# Altium schematic symbol library IC_ADI.SCHLIB: 3169 symbols (part 28 of 181)
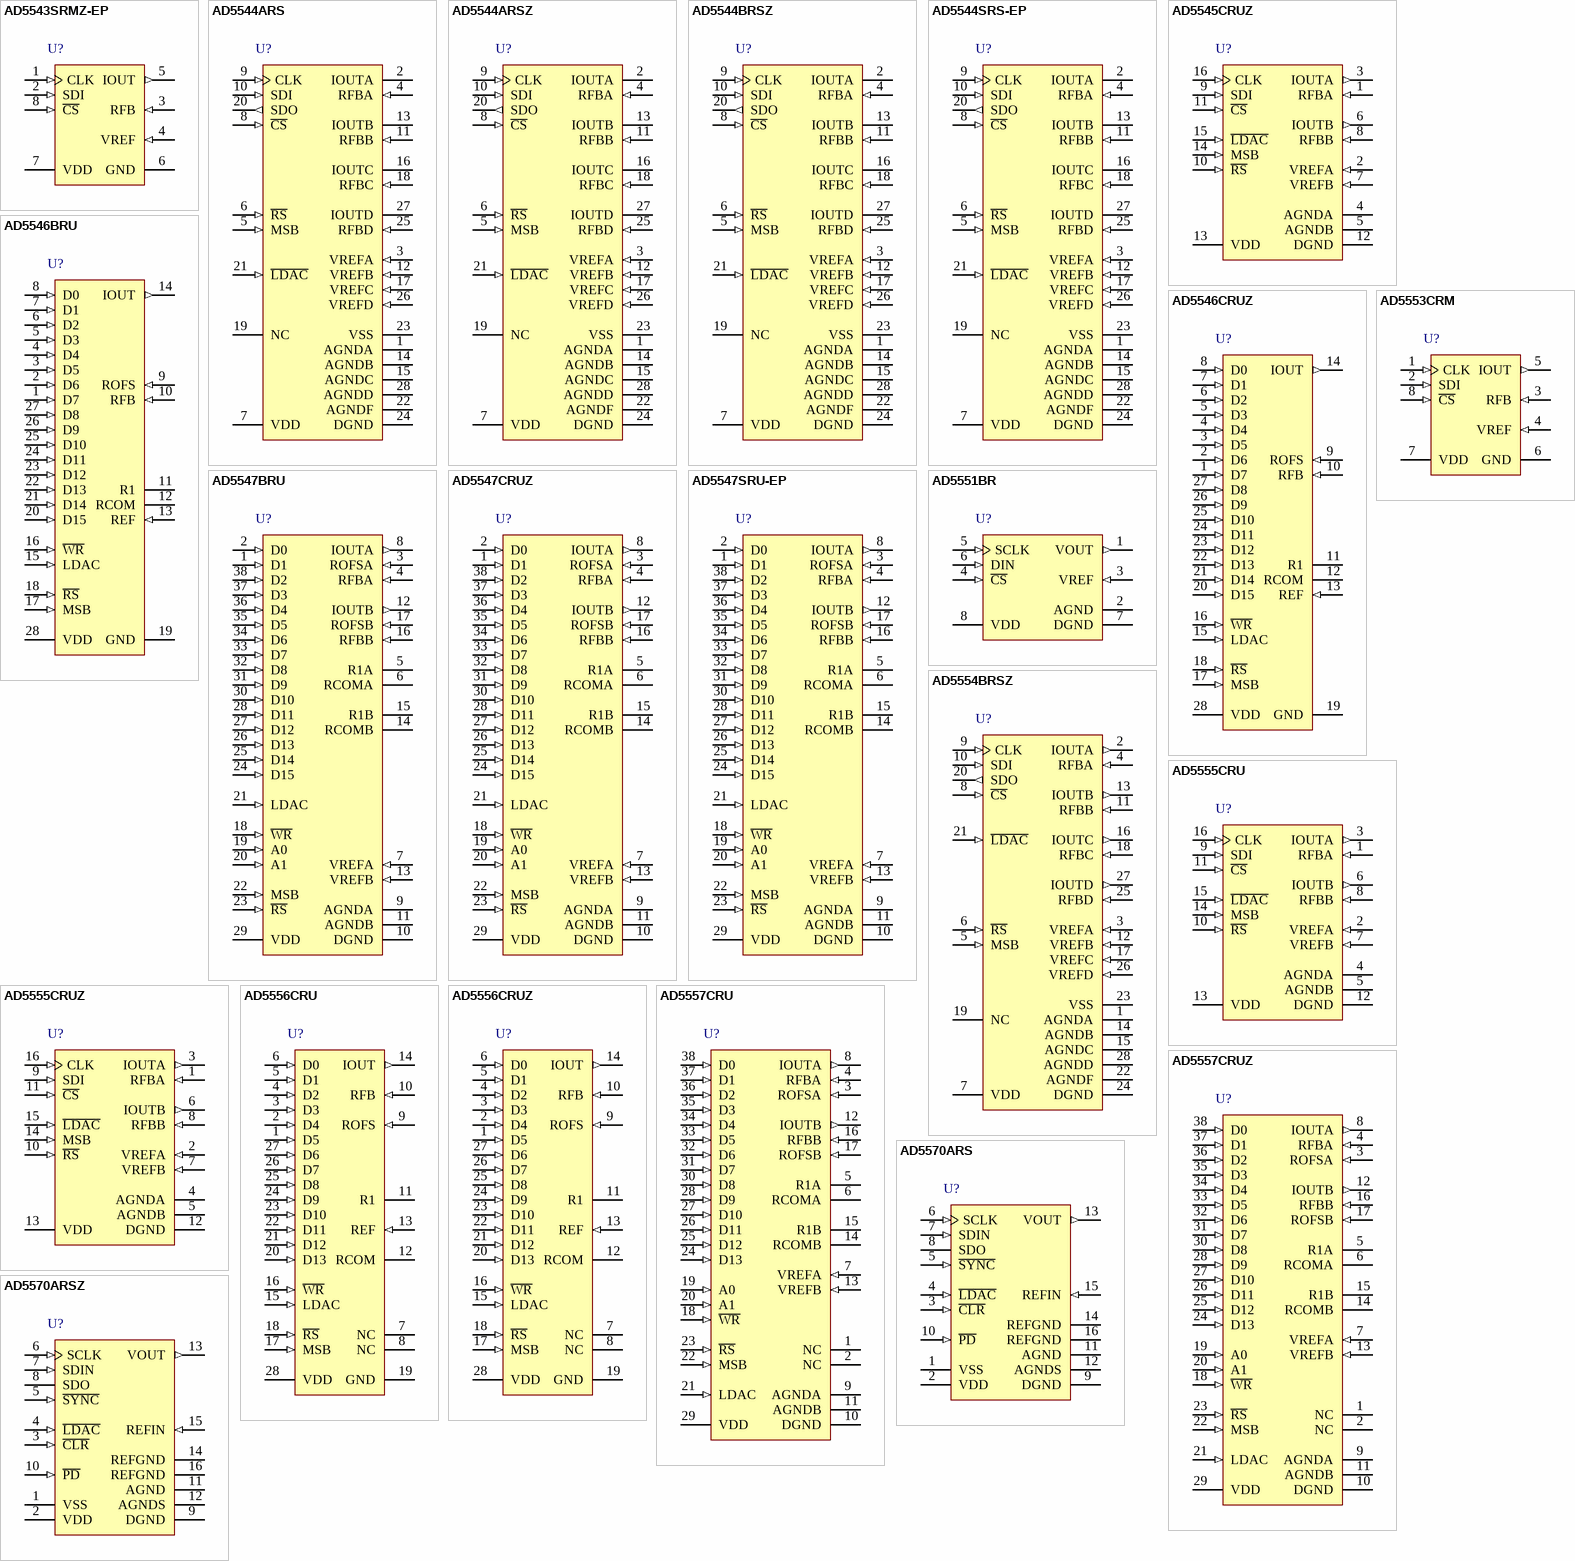
[diagram p218: symbols AD5543SRMZ-EP to AD5570ARSZ]

## AD5547BRU
designator U?
Dual 16-Bit Multiplying Dual Current Output Digital-to-Analog Converter with Parallel Interface, -40 to +125 degC, RU-38, Tube; Generic Part Number: AD5547; PartNumber: AD5547BRU; # DAC Outputs: 2; Max V+: 5.5V; Op Pwr Diss: 55礧; Resolution (Bits): 16; Settling Time: 500ns; Single Supply: Yes; DatasheetVersion: Rev.C; PackageVersion: Mar-2003; PackageReference: RU-38; PackageDescription: 38-Lead Thin Shrink Small Outline Package [TSSOP]; Supplier Part Number 1: AD5547BRU-ND; Supplier Part Number 2: 584-AD5547BRU; Packing: Tube; RoHS: N; Mounting Technology: Surface Mount; Code_JEDEC: MS-153BD-1; ComponentLink1Description: Manufacturer URL; ComponentLink2Description: Datasheet; ComponentLink3Description: Package Specification; ComponentLink4Description: Product URL; ComponentLink5Description: Reference Design URL
footprint TSSOP38_0.5 (Footprint not found)
pins: 1 D1 (in) "Digital Input Data Bit D1. Signal level must be =< VDD + 0.3 V.", 2 D0 (in) "Digital Input Data Bit D0. Signal level must be =< VDD + 0.3 V.", 3 ROFSA (in) "Bipolar Offset Resistor A. Accepts up to +/-18 V. In 2-quadrant mode, ROFSA ties to RFBA. In 4-quadrant mode, ROFSA ties to R1A and the external reference.", 4 RFBA (in) "Internal Matching Feedback Resistor A. Connects to the external op amp for I-to-V conversion.", 5 R1A "4-Quandrant Resistor. In 2-quadrant mode, R1A shorts to the VREFA pin. In 4-quadrant mode, R1A ties to ROFSA. Do not connect when operating in unipolar mode.", 6 RCOMA "Center Tap Point of the Two 4-Quadrant Resistors, R1A and R2A. In 4-quadrant mode, RCOMA ties to the inverting node of the reference amplifier. In 2-quadrant mode, RCOMA shorts to the associated VREFA pin. Do not connect if (See Datasheet)", 7 VREFA (in) "DAC A Reference Input in 2-Quadrant Mode, R2 Terminal in 4-Quadrant Mode. In 2-quadrant mode, VREFA is the reference input with constant input resistance vs. code. In 4-quadrant mode, VREFA is driven by the external (See Datasheet)", 8 IOUTA (out) "DAC A Current Output. Connects to the inverting terminal of external precision I-to-V op amp for voltage output.", 9 AGNDA (power) "DAC A Analog Ground.", 10 DGND (power) "Digital Ground.", 11 AGNDB (power) "DAC B Analog Ground.", 12 IOUTB (out) "DAC B Current Output. Connects to inverting terminal of external precision I-to-V op amp for voltage output.", 13 VREFB (in) "DAC B Reference Input Pin. Establishes DAC full-scale voltage. Constant input resistance vs. code. If configured with an external op amp for 4-quadrant multiplying, VREFB becomes -VREF.", 14 RCOMB "Center Tap Point of the Two 4-Quadrant Resistors, R1B and R2B. In 4-quadrant mode, RCOMB ties to the inverting node of the reference amplifier. In 2-quadrant mode, RCOMB shorts to the VREFB pin. Do not connect if operating (See Datasheet)", 15 R1B "4-Quandrant Resistor. In 2-quadrant mode, R1B shorts to the VREFB pin. In 4-quadrant mode, R1B ties to ROFSB. Do not connect if operating in unipolar mode.", 16 RFBB (in) "Internal Matching Feedback Resistor B. Connects to external op amp for I-to-V conversion.", 17 ROFSB (in) "Bipolar Offset Resistor B. Accepts up to +/-18 V. In 2-quadrant mode, ROFSB ties to RFBB. In 4-quadrant mode, ROFSB ties to R1B and an external reference.", 18 ~{WR} (in) "Write Control Digital Input In, Active Low. W\R\ transfers shift register data to the DAC register on the rising edge. Signal level must be =<VDD + 0.3 V.", 19 A0 (in) "Address Pin 0. Signal level must be =<VDD + 0.3 V.", 20 A1 (in) "Address Pin 1. Signal level must be =<VDD + 0.3 V.", 21 LDAC (in) "Digital Input Load DAC Control. Signal level must be =<VDD + 0.3 V.", 22 MSB (in) "Power-On Reset State. MSB = 0 corresponds to zero-scale reset; MSB = 1 corresponds to midscale reset. The signal level must be =<VDD + 0.3 V.", 23 ~{RS} (in) "Active low resets both input and DAC registers. Resets to zero-scale if MSB = 0 and resets to midscale if MSB = 1. Signal level must be =<VDD + 0.3 V.", 24 D15 (in) "Digital Input Data Bit D15. Signal level must be =< VDD + 0.3 V.", 25 D14 (in) "Digital Input Data Bit D14. Signal level must be =< VDD + 0.3 V.", 26 D13 (in) "Digital Input Data Bit D13. Signal level must be =< VDD + 0.3 V.", 27 D12 (in) "Digital Input Data Bit D12. Signal level must be =< VDD + 0.3 V.", 28 D11 (in) "Digital Input Data Bit D11. Signal level must be =< VDD + 0.3 V.", 29 VDD (power) "Positive Power Supply Input. The specified range of operation is 2.7 V to 5.5 V.", 30 D10 (in) "Digital Input Data Bit D10. Signal level must be =< VDD + 0.3 V.", 31 D9 (in) "Digital Input Data Bit D9. Signal level must be =< VDD + 0.3 V.", 32 D8 (in) "Digital Input Data Bit D8. Signal level must be =< VDD + 0.3 V.", 33 D7 (in) "Digital Input Data Bit D7. Signal level must be =< VDD + 0.3 V.", 34 D6 (in) "Digital Input Data Bit D6. Signal level must be =< VDD + 0.3 V.", 35 D5 (in) "Digital Input Data Bit D5. Signal level must be =< VDD + 0.3 V.", 36 D4 (in) "Digital Input Data Bit D4. Signal level must be =< VDD + 0.3 V.", 37 D3 (in) "Digital Input Data Bit D3. Signal level must be =< VDD + 0.3 V.", 38 D2 (in) "Digital Input Data Bit D2. Signal level must be =< VDD + 0.3 V."

## AD5547CRUZ
designator U?
Dual 16-Bit Multiplying Dual Current Output Digital-to-Analog Converter with Parallel Interface, -40 to +125 degC, RU-38, Pb-Free, Tube; Generic Part Number: AD5547; PartNumber: AD5547CRUZ; # DAC Outputs: 2; Max V+: 5.5V; Op Pwr Diss: 55礧; Resolution (Bits): 16; Settling Time: 500ns; Single Supply: Yes; DatasheetVersion: Rev.C; PackageVersion: Mar-2003; PackageReference: RU-38; PackageDescription: 38-Lead Thin Shrink Small Outline Package [TSSOP]; Supplier Part Number 1: AD5547CRUZ-ND; Supplier Part Number 2: 2312767; Supplier Part Number 3: 51R0726; Packing: Tube; RoHS: Y; Mounting Technology: Surface Mount; Code_JEDEC: MS-153BD-1; ComponentLink1Description: Manufacturer URL; ComponentLink2Description: Datasheet; ComponentLink3Description: Package Specification; ComponentLink4Description: Product URL; ComponentLink5Description: Reference Design URL
footprint TSSOP38_0.5 (Footprint not found)
pins: 1 D1 (in) "Digital Input Data Bit D1. Signal level must be =< VDD + 0.3 V.", 2 D0 (in) "Digital Input Data Bit D0. Signal level must be =< VDD + 0.3 V.", 3 ROFSA (in) "Bipolar Offset Resistor A. Accepts up to +/-18 V. In 2-quadrant mode, ROFSA ties to RFBA. In 4-quadrant mode, ROFSA ties to R1A and the external reference.", 4 RFBA (in) "Internal Matching Feedback Resistor A. Connects to the external op amp for I-to-V conversion.", 5 R1A "4-Quandrant Resistor. In 2-quadrant mode, R1A shorts to the VREFA pin. In 4-quadrant mode, R1A ties to ROFSA. Do not connect when operating in unipolar mode.", 6 RCOMA "Center Tap Point of the Two 4-Quadrant Resistors, R1A and R2A. In 4-quadrant mode, RCOMA ties to the inverting node of the reference amplifier. In 2-quadrant mode, RCOMA shorts to the associated VREFA pin. Do not connect if (See Datasheet)", 7 VREFA (in) "DAC A Reference Input in 2-Quadrant Mode, R2 Terminal in 4-Quadrant Mode. In 2-quadrant mode, VREFA is the reference input with constant input resistance vs. code. In 4-quadrant mode, VREFA is driven by the external (See Datasheet)", 8 IOUTA (out) "DAC A Current Output. Connects to the inverting terminal of external precision I-to-V op amp for voltage output.", 9 AGNDA (power) "DAC A Analog Ground.", 10 DGND (power) "Digital Ground.", 11 AGNDB (power) "DAC B Analog Ground.", 12 IOUTB (out) "DAC B Current Output. Connects to inverting terminal of external precision I-to-V op amp for voltage output.", 13 VREFB (in) "DAC B Reference Input Pin. Establishes DAC full-scale voltage. Constant input resistance vs. code. If configured with an external op amp for 4-quadrant multiplying, VREFB becomes -VREF.", 14 RCOMB "Center Tap Point of the Two 4-Quadrant Resistors, R1B and R2B. In 4-quadrant mode, RCOMB ties to the inverting node of the reference amplifier. In 2-quadrant mode, RCOMB shorts to the VREFB pin. Do not connect if operating (See Datasheet)", 15 R1B "4-Quandrant Resistor. In 2-quadrant mode, R1B shorts to the VREFB pin. In 4-quadrant mode, R1B ties to ROFSB. Do not connect if operating in unipolar mode.", 16 RFBB (in) "Internal Matching Feedback Resistor B. Connects to external op amp for I-to-V conversion.", 17 ROFSB (in) "Bipolar Offset Resistor B. Accepts up to +/-18 V. In 2-quadrant mode, ROFSB ties to RFBB. In 4-quadrant mode, ROFSB ties to R1B and an external reference.", 18 ~{WR} (in) "Write Control Digital Input In, Active Low. W\R\ transfers shift register data to the DAC register on the rising edge. Signal level must be =<VDD + 0.3 V.", 19 A0 (in) "Address Pin 0. Signal level must be =<VDD + 0.3 V.", 20 A1 (in) "Address Pin 1. Signal level must be =<VDD + 0.3 V.", 21 LDAC (in) "Digital Input Load DAC Control. Signal level must be =<VDD + 0.3 V.", 22 MSB (in) "Power-On Reset State. MSB = 0 corresponds to zero-scale reset; MSB = 1 corresponds to midscale reset. The signal level must be =<VDD + 0.3 V.", 23 ~{RS} (in) "Active low resets both input and DAC registers. Resets to zero-scale if MSB = 0 and resets to midscale if MSB = 1. Signal level must be =<VDD + 0.3 V.", 24 D15 (in) "Digital Input Data Bit D15. Signal level must be =< VDD + 0.3 V.", 25 D14 (in) "Digital Input Data Bit D14. Signal level must be =< VDD + 0.3 V.", 26 D13 (in) "Digital Input Data Bit D13. Signal level must be =< VDD + 0.3 V.", 27 D12 (in) "Digital Input Data Bit D12. Signal level must be =< VDD + 0.3 V.", 28 D11 (in) "Digital Input Data Bit D11. Signal level must be =< VDD + 0.3 V.", 29 VDD (power) "Positive Power Supply Input. The specified range of operation is 2.7 V to 5.5 V.", 30 D10 (in) "Digital Input Data Bit D10. Signal level must be =< VDD + 0.3 V.", 31 D9 (in) "Digital Input Data Bit D9. Signal level must be =< VDD + 0.3 V.", 32 D8 (in) "Digital Input Data Bit D8. Signal level must be =< VDD + 0.3 V.", 33 D7 (in) "Digital Input Data Bit D7. Signal level must be =< VDD + 0.3 V.", 34 D6 (in) "Digital Input Data Bit D6. Signal level must be =< VDD + 0.3 V.", 35 D5 (in) "Digital Input Data Bit D5. Signal level must be =< VDD + 0.3 V.", 36 D4 (in) "Digital Input Data Bit D4. Signal level must be =< VDD + 0.3 V.", 37 D3 (in) "Digital Input Data Bit D3. Signal level must be =< VDD + 0.3 V.", 38 D2 (in) "Digital Input Data Bit D2. Signal level must be =< VDD + 0.3 V."

## AD5547SRU-EP
designator U?
Dual 16-Bit Multiplying Dual Current Output Digital-to-Analog Converter with Parallel Interface, -55 to +125 degC, RU-38, Tube; Generic Part Number: AD5547; PartNumber: AD5547SRU-EP; # DAC Outputs: 2; Max V+: 5.5V; Op Pwr Diss: 55礧; Resolution (Bits): 16; Settling Time: 500ns; Single Supply: Yes; DatasheetVersion: Rev.0; PackageVersion: Mar-2003; PackageReference: RU-38; PackageDescription: 38-Lead Thin Shrink Small Outline Package [TSSOP]; Supplier Part Number 1: N/A; Packing: Tube; RoHS: N; Mounting Technology: Surface Mount; Code_JEDEC: MS-153BD-1; ComponentLink1Description: Manufacturer URL; ComponentLink2Description: Datasheet; ComponentLink3Description: Package Specification; ComponentLink4Description: Product URL; ComponentLink5Description: Reference Design URL
footprint TSSOP38_0.5 (Footprint not found)
pins: 1 D1 (in) "Digital Input Data Bit D1. Signal level must be =< VDD + 0.3 V.", 2 D0 (in) "Digital Input Data Bit D0. Signal level must be =< VDD + 0.3 V.", 3 ROFSA (in) "Bipolar Offset Resistor A. Accepts up to +/-18 V. In 2-quadrant mode, ROFSA ties to RFBA. In 4-quadrant mode, ROFSA ties to R1A and the external reference.", 4 RFBA (in) "Internal Matching Feedback Resistor A. Connects to the external op amp for I-to-V conversion.", 5 R1A "4-Quandrant Resistor. In 2-quadrant mode, R1A shorts to the VREFA pin. In 4-quadrant mode, R1A ties to ROFSA. Do not connect when operating in unipolar mode.", 6 RCOMA "Center Tap Point of the Two 4-Quadrant Resistors, R1A and R2A. In 4-quadrant mode, RCOMA ties to the inverting node of the reference amplifier. In 2-quadrant mode, RCOMA shorts to the associated VREFA pin. Do not connect if (See Datasheet)", 7 VREFA (in) "DAC A Reference Input in 2-Quadrant Mode, R2 Terminal in 4-Quadrant Mode. In 2-quadrant mode, VREFA is the reference input with constant input resistance vs. code. In 4-quadrant mode, VREFA is driven by the external (See Datasheet)", 8 IOUTA (out) "DAC A Current Output. Connects to the inverting terminal of external precision I-to-V op amp for voltage output.", 9 AGNDA (power) "DAC A Analog Ground.", 10 DGND (power) "Digital Ground.", 11 AGNDB (power) "DAC B Analog Ground.", 12 IOUTB (out) "DAC B Current Output. Connects to inverting terminal of external precision I-to-V op amp for voltage output.", 13 VREFB (in) "DAC B Reference Input Pin. Establishes DAC full-scale voltage. Constant input resistance vs. code. If configured with an external op amp for 4-quadrant multiplying, VREFB becomes -VREF.", 14 RCOMB "Center Tap Point of the Two 4-Quadrant Resistors, R1B and R2B. In 4-quadrant mode, RCOMB ties to the inverting node of the reference amplifier. In 2-quadrant mode, RCOMB shorts to the VREFB pin. Do not connect if operating (See Datasheet)", 15 R1B "4-Quandrant Resistor. In 2-quadrant mode, R1B shorts to the VREFB pin. In 4-quadrant mode, R1B ties to ROFSB. Do not connect if operating in unipolar mode.", 16 RFBB (in) "Internal Matching Feedback Resistor B. Connects to external op amp for I-to-V conversion.", 17 ROFSB (in) "Bipolar Offset Resistor B. Accepts up to +/-18 V. In 2-quadrant mode, ROFSB ties to RFBB. In 4-quadrant mode, ROFSB ties to R1B and an external reference.", 18 ~{WR} (in) "Write Control Digital Input In, Active Low. W\R\ transfers shift register data to the DAC register on the rising edge. Signal level must be =<VDD + 0.3 V.", 19 A0 (in) "Address Pin 0. Signal level must be =<VDD + 0.3 V.", 20 A1 (in) "Address Pin 1. Signal level must be =<VDD + 0.3 V.", 21 LDAC (in) "Digital Input Load DAC Control. Signal level must be =<VDD + 0.3 V.", 22 MSB (in) "Power-On Reset State. MSB = 0 corresponds to zero-scale reset; MSB = 1 corresponds to midscale reset. The signal level must be =<VDD + 0.3 V.", 23 ~{RS} (in) "Active low resets both input and DAC registers. Resets to zero-scale if MSB = 0 and resets to midscale if MSB = 1. Signal level must be =<VDD + 0.3 V.", 24 D15 (in) "Digital Input Data Bit D15. Signal level must be =< VDD + 0.3 V.", 25 D14 (in) "Digital Input Data Bit D14. Signal level must be =< VDD + 0.3 V.", 26 D13 (in) "Digital Input Data Bit D13. Signal level must be =< VDD + 0.3 V.", 27 D12 (in) "Digital Input Data Bit D12. Signal level must be =< VDD + 0.3 V.", 28 D11 (in) "Digital Input Data Bit D11. Signal level must be =< VDD + 0.3 V.", 29 VDD (power) "Positive Power Supply Input. The specified range of operation is 2.7 V to 5.5 V.", 30 D10 (in) "Digital Input Data Bit D10. Signal level must be =< VDD + 0.3 V.", 31 D9 (in) "Digital Input Data Bit D9. Signal level must be =< VDD + 0.3 V.", 32 D8 (in) "Digital Input Data Bit D8. Signal level must be =< VDD + 0.3 V.", 33 D7 (in) "Digital Input Data Bit D7. Signal level must be =< VDD + 0.3 V.", 34 D6 (in) "Digital Input Data Bit D6. Signal level must be =< VDD + 0.3 V.", 35 D5 (in) "Digital Input Data Bit D5. Signal level must be =< VDD + 0.3 V.", 36 D4 (in) "Digital Input Data Bit D4. Signal level must be =< VDD + 0.3 V.", 37 D3 (in) "Digital Input Data Bit D3. Signal level must be =< VDD + 0.3 V.", 38 D2 (in) "Digital Input Data Bit D2. Signal level must be =< VDD + 0.3 V."

## AD5551BR
designator U?
Single 14-Bit Digital-to-Analog Converter with Serial Interface, 2.7 to 5.5 V, -40 to +85 degC, R-8, Tube; Generic Part Number: AD5551; PartNumber: AD5551BR; # DAC Outputs: 1; Max V+: 5.5V; Op Pwr Diss: 6.05mW; Resolution (Bits): 14; Settling Time: 1祍; Single Supply: Yes; DatasheetVersion: Rev.A; PackageVersion: 060506-A; PackageReference: R-8; PackageDescription: 8-Lead Standard Small Outline Package [SOIC_N] Narrow Body; Supplier Part Number 1: AD5551BR-ND; Supplier Part Number 2: 584-AD5551BR; Packing: Tube; RoHS: N; Mounting Technology: Surface Mount; Code_JEDEC: MS-012-AA; Code_IPC: SOIC127P600-8; ComponentLink1Description: Manufacturer URL; ComponentLink2Description: Datasheet; ComponentLink3Description: Package Specification; ComponentLink4Description: Product URL
footprint SOIC8_1.27 (Footprint not found)
pins: 1 VOUT (out) "Analog Output Voltage from the DAC.", 2 AGND (power) "Ground Reference Point for Analog Circuitry.", 3 VREF (in) "This is the voltage reference input for the DAC. Connect to external reference ranges from 2 V to VDD.", 4 ~{CS} (in) "This is an active low-logic input signal. The chip select signal is used to frame the serial data input.", 5 SCLK (in) "Clock Input. Data is clocked into the input register on the rising edge of SCLK. Duty cycle must be between 40% and 60%.", 6 DIN (in) "Serial Data Input. This device accepts 14-bit words. Data is clocked into the input register on the rising edge of SCLK.", 7 DGND (power) "Digital Ground. Ground reference for digital circuitry.", 8 VDD (power) "Analog Supply Voltage, 2.7 V to 5.5 V +/- 10%."

## AD5553CRM
designator U?
Single 14-Bit Current Output Digital-to-Analog Converter with Serial Interface, -40 to +85 degC, RM-8, Tube; Generic Part Number: AD5553; PartNumber: AD5553CRM; # DAC Outputs: 1; Max V+: 5.5V; Op Pwr Diss: 55礧; Resolution (Bits): 14; Settling Time: 500ns; Single Supply: Yes; DatasheetVersion: Rev.F; PackageVersion: Aug-2005; PackageReference: RM-8; PackageDescription: 8-Lead Mini Small Outline Package [MSOP]; Supplier Part Number 1: AD5553CRM-ND; Supplier Part Number 2: 584-AD5553CRM; Packing: Tube; RoHS: N; Mounting Technology: Surface Mount; Code_JEDEC: MO-187-AA; ComponentLink1Description: Manufacturer URL; ComponentLink2Description: Datasheet; ComponentLink3Description: Package Specification; ComponentLink4Description: Product URL
footprint VSSOP8_0.65 (Footprint not found)
pins: 1 CLK (in) "Clock Input. Positive-edge triggered, clocks data into shift register.", 2 SDI (in) "Serial Register Input. Data loads directly into the shift register MSB first. Extra leading bits are ignored.", 3 RFB (in) "Internal Matching Feedback Resistor. This pin connects to an external op amp for voltage output.", 4 VREF (in) "DAC Reference Input Pin. Establishes DAC full-scale voltage. Constant input resistance vs. code.", 5 IOUT (out) "DAC Current Output. This pin connects to the inverting terminal of the external precision I-to-V op amp for voltage output.", 6 GND (power) "Analog and Digital Ground.", 7 VDD (power) "Positive Power Supply Input. Specified range of operation at 5 V +/- 10%.", 8 ~{CS} (in) "Chip Select. Active low digital input. Transfers shift-register data to DAC register on rising edge.See Table 4 for operation."

## AD5554BRSZ
designator U?
Quad 14-Bit Digital-to-Analog Converter with Serial Interface, -40 to +125 degC, RS-28, Pb-Free, Tube; Generic Part Number: AD5554; PartNumber: AD5554BRSZ; # DAC Outputs: 4; Max V+: 5.5V; Op Pwr Diss: 1.25mW; Resolution (Bits): 14; Settling Time: 900ns; Single Supply: Yes; DatasheetVersion: Rev.F; PackageVersion: 060106-A; PackageReference: RS-28; PackageDescription: 28-Lead Shrink Small Outline Package [SSOP]; Supplier Part Number 1: AD5554BRSZ-ND; Supplier Part Number 2: 12M8560; Supplier Part Number 3: 584-AD5554BRSZ; Packing: Tube; RoHS: Y; Mounting Technology: Surface Mount; Code_JEDEC: MO-150-AH; ComponentLink1Description: Manufacturer URL; ComponentLink2Description: Datasheet; ComponentLink3Description: Package Specification; ComponentLink4Description: Product URL
footprint SSOP28_0.65 (Footprint not found)
pins: 1 AGNDA (power) "DAC A Analog Ground.", 2 IOUTA (out) "DAC A Current Output.", 3 VREFA (in) "DAC A Reference Voltage Input Terminal. Establishes DAC A full-scale output voltage. This pin can be tied to the VDD pin.", 4 RFBA (in) "Establish the voltage output for DAC A by connecting to an external amplifier output.", 5 MSB (in) "MSB Bit. Set pin during a reset pulse (R\S\) or at system power-on if tied to ground or VDD.", 6 ~{RS} (in) "Reset Pin, Active Low Input. Input registers and DAC registers are set to all 0s or half-scale code (0x8000 for the AD5544 and 0x2000 for the AD5554), determined by the voltage on the MSB pin. Register data = 0x0000 when MSB (See Datasheet)", 7 VDD (power) "Positive Power Supply Input. Specified range of operation: 5 V +/- 10%.", 8 ~{CS} (in) "Chip Select, Active Low Input. Disables shift register loading when high. Transfers serial register data to the input register when C\S\/L\D\A\C\ returns high. Does not affect L\D\A\C\ operation.", 9 CLK (in) "Clock Input. Positive edge clocks data into the shift register.", 10 SDI (in) "Serial Data Input. Input data loads directly into the shift register.", 11 RFBB (in) "Establish the voltage output for DAC B by connecting to an external amplifier output.", 12 VREFB (in) "DAC B Reference Voltage Input Terminal. Establishes DAC B full-scale output voltage. This pin can be tied to the VDD pin.", 13 IOUTB (out) "DAC B Current Output.", 14 AGNDB (power) "DAC B Analog Ground.", 15 AGNDC (power) "DAC C Analog Ground.", 16 IOUTC (out) "DAC C Current Output.", 17 VREFC (in) "DAC C Reference Voltage Input Terminal. Establishes DAC C full-scale output voltage. This pin can be tied to the VDD pin.", 18 RFBC (in) "Establish the voltage output for DAC C by connecting to an external amplifier output.", 19 NC "No Connect. Leave the pin unconnected.", 20 SDO (out) "Serial Data Output. Input data loads directly into the shift register. Data appears at SDO at 19 clock pulses for the AD5544 and 17 clock pulses for the AD5554 after input at the SDI pin.", 21 ~{LDAC} (in) "Load DAC Register Strobe, Level Sensitive Active Low. Transfers all input register data to DAC registers. Asynchronous active low input. See Table 8 and Table 9 for operation.", 22 AGNDF (power) "High Current Analog Force Ground.", 23 VSS (power) "Negative Bias Power Supply Input. Specified range of operation: -5.5 V to +0.3 V.", 24 DGND (power) "Digital Ground Pin.", 25 RFBD (in) "Establish the voltage output for DAC D by connecting to an external amplifier output.", 26 VREFD (in) "DAC D Reference Voltage Input Terminal. Establishes DAC D full-scale output voltage. This pin can be tied to the VDD pin.", 27 IOUTD (out) "DAC D Current Output.", 28 AGNDD (power) "DAC D Analog Ground."

## AD5555CRU
designator U?
Dual 14-Bit Digital-to-Analog Converter with Serial Interface, -40 to +85 degC, RU-16, Tube; Generic Part Number: AD5555; PartNumber: AD5555CRU; # DAC Outputs: 2; Max V+: 5.5V; Op Pwr Diss: 55礧; Resolution (Bits): 14; Settling Time: 500ns; Single Supply: Yes; DatasheetVersion: Rev.E; PackageVersion: Nov-2002; PackageReference: RU-16; PackageDescription: 16-Lead Thin Shrink Small Outline Package [TSSOP]; Supplier Part Number 1: AD5555CRU-ND; Supplier Part Number 2: 584-AD5555CRU; Packing: Tube; RoHS: N; Mounting Technology: Surface Mount; Code_JEDEC: MO-153-AB; ComponentLink1Description: Manufacturer URL; ComponentLink2Description: Datasheet; ComponentLink3Description: Package Specification; ComponentLink4Description: Product URL
footprint TSSOP16_0.65 (Footprint not found)
pins: 1 RFBA (in) "Establish voltage output for DAC A by connecting this pin to an external amplifier output.", 2 VREFA (in) "DAC A Reference Voltage Input Terminal. Establishes DAC A full-scale output voltage. This pin can be tied to the VDD pin.", 3 IOUTA (out) "DAC A Current Output.", 4 AGNDA (power) "DAC A Analog Ground.", 5 AGNDB (power) "DAC B Analog Ground.", 6 IOUTB (out) "DAC B Current Output", 7 VREFB (in) "DAC B Reference Voltage Input Terminal. Establishes DAC B full-scale output voltage. This pin can be tied to the VDD pin.", 8 RFBB (in) "Establish voltage output for DAC B by the RFBB pin connecting to an external amplifier output.", 9 SDI (in) "Serial Data Input. Input data loads directly into the shift register.", 10 ~{RS} (in) "Reset Pin, Active Low Input. Input registers and DAC registers are set to all 0s or midscale. Register Data = 0x0000 when MSB = 0. Register Data = 0x8000 for AD5545 and 0x2000 for AD5555 when MSB = 1.", 11 ~{CS} (in) "Chip Select, Active Low Input. Disables shift register loading when high. Transfers serial register data to the input register when C\S\/L\D\A\C\ returns high. This does not affect L\D\A\C\ operation.", 12 DGND (power) "Digital Ground Pin.", 13 VDD (power) "Positive Power Supply Input. Specified range of operation 5 V +/- 10% or 3 V +/- 10%.", 14 MSB (in) "MSB bit sets output to either 0 or midscale during a RESET pulse (R\S\) or at system power-on. Output equals zero scale when MSB = 0 and midscale when MSB = 1. MSB pin can also be tied permanently to ground or VDD.", 15 ~{LDAC} (in) "Load DAC Register Strobe, Level Sensitive Active Low. Transfers all input register data to DAC registers. Asynchronous active low input. See Table 7 and Table 8 for operation.", 16 CLK (in) "Clock Input. Positive edge clocks data into shift register."

## AD5555CRUZ
designator U?
Dual 14-Bit Digital-to-Analog Converter with Serial Interface, -40 to +85 degC, RU-16, Pb-Free, Tube; Generic Part Number: AD5555; PartNumber: AD5555CRUZ; # DAC Outputs: 2; Max V+: 5.5V; Op Pwr Diss: 55礧; Resolution (Bits): 14; Settling Time: 500ns; Single Supply: Yes; DatasheetVersion: Rev.E; PackageVersion: Nov-2002; PackageReference: RU-16; PackageDescription: 16-Lead Thin Shrink Small Outline Package [TSSOP]; Supplier Part Number 1: AD5555CRUZ-ND; Supplier Part Number 2: 59K4227; Supplier Part Number 3: 584-AD5555CRUZ; Packing: Tube; RoHS: Y; Mounting Technology: Surface Mount; Code_JEDEC: MO-153-AB; ComponentLink1Description: Manufacturer URL; ComponentLink2Description: Datasheet; ComponentLink3Description: Package Specification; ComponentLink4Description: Product URL
footprint TSSOP16_0.65 (Footprint not found)
pins: 1 RFBA (in) "Establish voltage output for DAC A by connecting this pin to an external amplifier output.", 2 VREFA (in) "DAC A Reference Voltage Input Terminal. Establishes DAC A full-scale output voltage. This pin can be tied to the VDD pin.", 3 IOUTA (out) "DAC A Current Output.", 4 AGNDA (power) "DAC A Analog Ground.", 5 AGNDB (power) "DAC B Analog Ground.", 6 IOUTB (out) "DAC B Current Output", 7 VREFB (in) "DAC B Reference Voltage Input Terminal. Establishes DAC B full-scale output voltage. This pin can be tied to the VDD pin.", 8 RFBB (in) "Establish voltage output for DAC B by the RFBB pin connecting to an external amplifier output.", 9 SDI (in) "Serial Data Input. Input data loads directly into the shift register.", 10 ~{RS} (in) "Reset Pin, Active Low Input. Input registers and DAC registers are set to all 0s or midscale. Register Data = 0x0000 when MSB = 0. Register Data = 0x8000 for AD5545 and 0x2000 for AD5555 when MSB = 1.", 11 ~{CS} (in) "Chip Select, Active Low Input. Disables shift register loading when high. Transfers serial register data to the input register when C\S\/L\D\A\C\ returns high. This does not affect L\D\A\C\ operation.", 12 DGND (power) "Digital Ground Pin.", 13 VDD (power) "Positive Power Supply Input. Specified range of operation 5 V +/- 10% or 3 V +/- 10%.", 14 MSB (in) "MSB bit sets output to either 0 or midscale during a RESET pulse (R\S\) or at system power-on. Output equals zero scale when MSB = 0 and midscale when MSB = 1. MSB pin can also be tied permanently to ground or VDD.", 15 ~{LDAC} (in) "Load DAC Register Strobe, Level Sensitive Active Low. Transfers all input register data to DAC registers. Asynchronous active low input. See Table 7 and Table 8 for operation.", 16 CLK (in) "Clock Input. Positive edge clocks data into shift register."
